# Altium footprint library Altium_Lib.PcbLib: 334 footprints (part 13 of 21)
Each footprint in its own frame and in the unit in brackets; x right, y up, seen from the top. Pads: shape width x height; smd on the part's side, far side on the other; paste and mask are expansions set on the pad; w line width, h text height; cw(c..) or ccw(c..) is an arc to the next point about the centre after c.
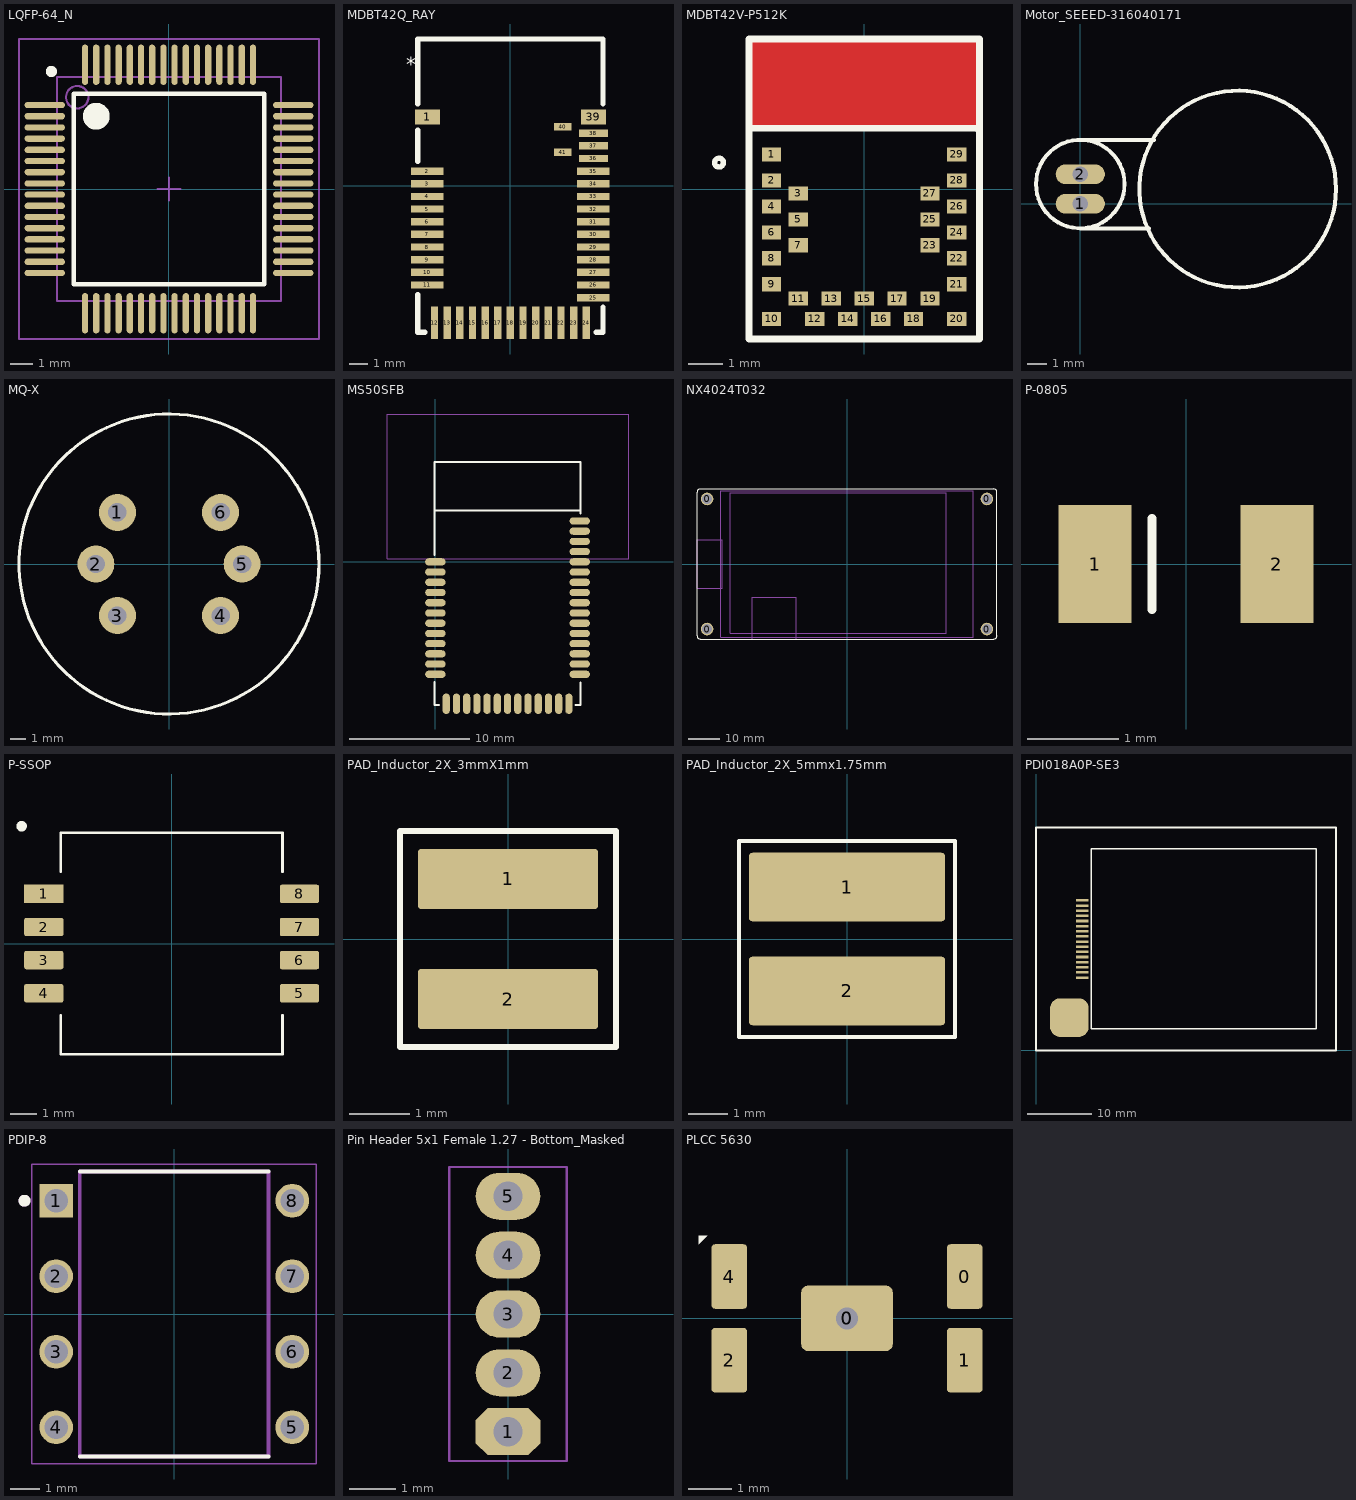
[diagram p12: the footprints below, top view; thin cyan lines are the x and y axes]

## LQFP-64_N [mm]
pads (64):
  oval 1.8x0.28 smd: 1(-5.55,3.75) 2(-5.55,3.25) 3(-5.55,2.75) 4(-5.55,2.25) 5(-5.55,1.75) 6(-5.55,1.25) 7(-5.55,0.75) 8(-5.55,0.25) 9(-5.55,-0.25) 10(-5.55,-0.75) 11(-5.55,-1.25) 12(-5.55,-1.75) 13(-5.55,-2.25) 14(-5.55,-2.75) 15(-5.55,-3.25) 16(-5.55,-3.75) 33(5.55,-3.75) 34(5.55,-3.25) 35(5.55,-2.75) 36(5.55,-2.25) 37(5.55,-1.75) 38(5.55,-1.25) 39(5.55,-0.75) 40(5.55,-0.25) 41(5.55,0.25) 42(5.55,0.75) 43(5.55,1.25) 44(5.55,1.75) 45(5.55,2.25) 46(5.55,2.75) 47(5.55,3.25) 48(5.55,3.75)
  oval 0.28x1.8 smd: 17(-3.75,-5.55) 18(-3.25,-5.55) 19(-2.75,-5.55) 20(-2.25,-5.55) 21(-1.75,-5.55) 22(-1.25,-5.55) 23(-0.75,-5.55) 24(-0.25,-5.55) 25(0.25,-5.55) 26(0.75,-5.55) 27(1.25,-5.55) 28(1.75,-5.55) 29(2.25,-5.55) 30(2.75,-5.55) 31(3.25,-5.55) 32(3.75,-5.55) 49(3.75,5.55) 50(3.25,5.55) 51(2.75,5.55) 52(2.25,5.55) 53(1.75,5.55) 54(1.25,5.55) 55(0.75,5.55) 56(0.25,5.55) 57(-0.25,5.55) 58(-0.75,5.55) 59(-1.25,5.55) 60(-1.75,5.55) 61(-2.25,5.55) 62(-2.75,5.55) 63(-3.25,5.55) 64(-3.75,5.55)
Top Overlay:
  circle w0.25: c-5.25,5.25 r0.125
  circle w0.6: c-3.25,3.25 r0.3
  lines w0.2: -4.25,-4.25 -4.25,4.25 4.25,4.25 4.25,-4.25 -4.25,-4.25
Mechanical 13:
  circle w0.1: c-4.1,4.1 r0.5
  lines w0.1: -5,-5 -5,5 5,5 5,-5 -5,-5
Mechanical 15:
  lines w0.1: -0.5,0 0.5,0 ; 0,-0.5 0,0.5 ; -6.7,-6.7 -6.7,6.7 6.7,6.7 6.7,-6.7 -6.7,-6.7
3D body "User Library-LQFP64_Grid_0_5.STEP": height 1.6, standoff 0, extent -5.999,-6 6.001,6

## MDBT42Q_RAY [mil]
pads (41):
  rect 55x32 smd: 1(-181.1,149.8) 39(181.1,149.8)
  rect 70.87x16 smd: 2(-181.1,31.7) 3(-181.1,4.1) 4(-181.1,-23.5) 5(-181.1,-51.1) 6(-181.1,-78.7) 7(-181.1,-106.3) 8(-181.1,-133.9) 9(-181.1,-161.5) 10(-181.1,-189.1) 11(-181.1,-216.7) 25(181.1,-244.3) 26(181.1,-216.7) 27(181.1,-189.1) 28(181.1,-161.5) 29(181.1,-133.9) 30(181.1,-106.3) 31(181.1,-78.7) 32(181.1,-51.1) 33(181.1,-23.5) 34(181.1,4.1) 35(181.1,31.7)
  rect 16x70.87 smd: 12(-165.6,-299.2) 13(-138,-299.2) 14(-110.4,-299.2) 15(-82.8,-299.2) 16(-55.2,-299.2) 17(-27.6,-299.2) 18(0,-299.2) 19(27.6,-299.2) 20(55.2,-299.2) 21(82.8,-299.2) 22(110.4,-299.2) 23(138,-299.2) 24(165.6,-299.2)
  rect 62.99x16 smd: 36(181.1,59.3) 37(181.1,86.9) 38(181.1,114.5)
  rect 39x16 smd: 40(114.2,128.3) 41(114.2,73.1)
Top Overlay:
  lines w11.81: -202,-237.8 -202,-320 -186.7,-320 ; -202,52.8 -202,120.7 ; -202,178.9 -202,320 202,320 202,178.9 ; 186.7,-320 202,-320 202,-265.4
  text "*" at -227,249.61 h31.25
Multi-Layer:
  pour cut-out: -202,320 202,320 202,-320 -202,-320
3D body "mdbt42q.stp": height 86.61, standoff 0, extent -197,-314.92 196.7,315

## MDBT42V-P512K [mil]
pads (29):
  rect 22x16 smd: 1(-105.31,39.37) 2(-105.31,9.84) 3(-74.8,-4.92) 4(-105.31,-19.68) 5(-74.8,-34.45) 6(-105.31,-49.21) 7(-74.8,-63.98) 8(-105.31,-78.74) 9(-105.31,-108.27) 10(-105.31,-147.64) 11(-74.8,-124.61) 12(-56.1,-147.64) 13(-37.4,-124.61) 14(-18.7,-147.64) 15(0,-124.61) 16(18.7,-147.64) 17(37.4,-124.61) 18(56.1,-147.64) 19(74.8,-124.61) 20(105.31,-147.64) 21(105.31,-108.27) 22(105.31,-78.74) 23(74.8,-63.98) 24(105.31,-49.21) 25(74.8,-34.45) 26(105.31,-19.68) 27(74.8,-4.92) 28(105.31,9.84) 29(105.31,39.37)
Top Layer:
  pour cut-out: -127.95,167.32 127.95,167.32 127.95,68.9 -127.95,68.9
Bottom Layer:
  pour cut-out: -127.95,167.32 127.95,167.32 127.95,68.9 -127.95,68.9
Top Overlay:
  circle w6: c-165,30 r5
  lines w7.87: -130.35,69.47 127.95,68.9 ; -131,-170.5 131,-170.5 131,170.5 -131,170.5 -131,-170.5
Mechanical 2:
  text "STAY AWAY" at -98.43,98.43 h39.37
3D body: height 55.12, standoff 3.94, extent -120,-160 120,55
3D body: height 19.68, standoff 0, extent -130,-170 130,170

## Motor_SEEED-316040171 [mm]
pads (2):
  oval 2.5x1 hole 0.8: 1(0,0) 2(0,1.5)
Top Overlay:
  circle w0.2: c0,1 r2.25
  circle w0.2: c8,0.75 r5
  lines w0.2: 0,-1.25 3.5,-1.25 ; 0,3.25 3.75,3.25
3D body "Vibration Motor v1.step": height 3, standoff -0.61, extent -0.474,-3.5 11.974,4.582

## MQ-X [mm] "MQ-X Type Gas Sensor"
height 10
pads (6):
  round 2.4 hole 1.2 unplated: 1(-3.35,3.35) 2(-4.75,0) 3(-3.35,-3.35) 4(3.35,-3.35) 5(4.75,0) 6(3.35,3.35)
Top Overlay:
  circle w0.2: c0,0 r9.75
3D body: height 10, standoff 8.8, extent -9.749,-9.749 9.749,9.749

## MS50SFB [mm] "Respect stay away lines if not model 3"
pads (41):
  oval 1.7x0.6 smd mask+0.06: 1(0,0) 2(0,-0.85) 3(0,-1.7) 4(0,-2.55) 5(0,-3.4) 6(0,-4.25) 7(0,-5.1) 8(0,-5.95) 9(0,-6.8) 10(0,-7.65) 11(0,-8.5) 12(0,-9.35) 26(12,-9.35) 27(12,-8.5) 28(12,-7.65) 29(12,-6.8) 30(12,-5.95) 31(12,-5.1) 32(12,-4.25) 33(12,-3.4) 34(12,-2.55) 35(12,-1.7) 36(12,-0.85) 37(12,0) 38(12,0.85) 39(12,1.701) 40(12,2.551) 41(12,3.401)
  oval 0.6x1.7 smd mask+0.06: 13(0.9,-11.8) 14(1.75,-11.8) 15(2.6,-11.8) 16(3.45,-11.8) 17(4.3,-11.8) 18(5.15,-11.8) 19(6,-11.8) 20(6.85,-11.8) 21(7.7,-11.8) 22(8.55,-11.8) 23(9.4,-11.8) 24(10.25,-11.8) 25(11.1,-11.8)
Top Overlay:
  lines w0.16: -0.075,-9.973 -0.075,-11.884 0.3,-11.884 ; -0.075,0.582 -0.075,8.291 12.075,8.291 12.075,4 ; -0.061,4.265 12.075,4.265 ; 11.643,-11.884 12.075,-11.884 12.075,-10.015
Mechanical 2:
  lines w0.1: -4,0.265 16.075,0.265 16.075,12.291 -4,12.291 -4,0.265
  text "STAY AWAY" at 2.31,5.81 h1.52
3D body: height 0.6, standoff 0, extent 0.025,-11.784 11.975,8.166
3D body: height 2, standoff 0.6, extent 0.9,-10.494 11.1,3.401

## NX4024T032 [mm]
pads (4):
  round 4 hole 3.2 unplated mask+0.05: 0(-44.3,-20.6) 0(-44.3,20.6) 0(44.3,-20.6) 0(44.3,20.6)
Top Overlay:
  lines w0.1: -47.5,-22.75 ccw(c-46.5,-22.75) -46.5,-23.75 46.5,-23.75 ; -47.5,-22.75 -47.5,-22.75 ; -47.5,-22.75 -47.5,22.75 cw(c-46.5,22.75) -46.5,23.75 ; -46.5,23.75 -46.5,23.75 ; -46.5,23.75 46.5,23.75 cw(c46.5,22.75) 47.5,22.75 47.5,-22.75 ; 46.5,-23.75 ccw(c46.5,-22.75) 47.5,-22.75 ; 46.5,-23.75 46.5,-23.75 ; 47.5,-22.75 47.5,-22.75
Mechanical 27:
  circle w0.1: c-44.3,-20.6 r1.6
  circle w0.1: c-44.3,20.6 r1.6
  circle w0.1: c44.3,20.6 r1.6
  circle w0.1: c44.3,-20.6 r1.6
Mechanical 28:
  lines w0.1: -40,-23.25 -40,23.25 40,23.25 40,-23.25 -40,-23.25
Mechanical 29:
  lines w0.1: -37,-22 -37,22.5 31.5,22.5 31.5,-22 -37,-22
Mechanical 30:
  lines w0.1: -47.5,-7.75 -47.5,7.75 -39.5,7.75 -39.5,-7.75 -47.5,-7.75
Mechanical 31:
  lines w0.1: -30,-23.75 -30,-10.5 -16,-10.5 -16,-23.75 ; -30,-23.75 -16,-23.75 ; -30,-23.75 -16,-23.75 ; -30,-23.75 -16,-23.75
3D body "NX4024T032.step": height 11.55, standoff 0, extent -47.5,-24 47.5,24

## P-0805 [mm]
pads (2):
  rect 0.8x1.3 smd: 1(-1,0) 2(1,0)
Top Overlay:
  lines w0.1: -0.375,-0.5 -0.375,0.5
3D body "SW3dPS-LED SMD0805.STEP": height 0.85, standoff 0.01, extent -1.031,-0.431 1.031,0.475

## P-SSOP [mm]
pads (8):
  rect 1.5x0.7 smd mask+0.05: 1(-4.9,1.905)
  rrect20% 1.5x0.7 smd mask+0.05: 2(-4.9,0.635) 3(-4.9,-0.635) 4(-4.9,-1.905) 5(4.9,-1.905) 6(4.9,-0.635) 7(4.9,0.635) 8(4.9,1.905)
Top Overlay:
  circle w0.2: c-5.75,4.5 r0.1
  lines w0.1: -4.25,-2.75 -4.25,-4.25 4.25,-4.25 4.25,-2.75 ; -4.25,2.75 -4.25,4.25 4.25,4.25 4.25,2.75
3D body "User Library-ZlozenieMPXH6400A.STEP": height 9.75, standoff 0.08, extent -5.325,-4.15 5.325,4.1

## PAD_Inductor_2X_3mmX1mm [mm]
pads (2):
  rrect10% 3x1 smd paste-3: 1(0,1) 2(0,-1)
Top Overlay:
  lines w0.1: -1.8,-1.8 -1.8,1.8 1.8,1.8 1.8,-1.8 -1.8,-1.8

## PAD_Inductor_2X_5mmx1.75mm [mm]
pads (2):
  rrect10% 5x1.75 smd: 1(0,1.325) 2(0,-1.325)
Top Overlay:
  lines w0.1: -2.75,-2.5 -2.75,2.5 2.75,2.5 2.75,-2.5 -2.75,-2.5

## PCM0802B-RN-YBS-02 [mm]
3D body "LCD_2x8.STEP": height 17.2, standoff 8.99, extent -1.7,-8.38 56.3,23.62

## PDI018A0P-SE3 [mm]
pads (17):
  rrect50% 2x0.4 smd paste-2: 1(7.2,11.35) 2(7.2,12.15) 3(7.2,12.95) 4(7.2,13.75) 5(7.2,14.55) 6(7.2,15.35) 7(7.2,16.15) 8(7.2,16.95) 9(7.2,17.75) 10(7.2,18.55) 11(7.2,19.35) 12(7.2,20.15) 13(7.2,20.95) 14(7.2,21.75) 15(7.2,22.55) 16(7.2,23.35)
  rrect50% 6x6 smd paste-6: ""(5.2,5.1)
Top Overlay:
  lines w0.254: 8.2,0 0,0 ; 0,0 0,34.7 46.7,34.7 46.7,0 0,0 ; 8.6,3.4 43.6,3.4 43.6,31.4 8.6,31.4 8.6,3.4
3D body "LCD.STEP": height 2.6, standoff 0.2, extent -0.05,0 46.7,34.7

## PDIP-8 [mm]
pads (8):
  rect 1.13x1.13 hole 0.78: 1(-3.97,3.81)
  round 1.13 hole 0.78: 2(-3.97,1.27) 3(-3.97,-1.27) 4(-3.97,-3.81) 5(3.97,-3.81) 6(3.97,-1.27) 7(3.97,1.27) 8(3.97,3.81)
Top Overlay:
  circle w0.2: c-5.035,3.81 r0.1
  lines w0.127: -3.175,-4.795 3.175,-4.795 ; -3.175,4.795 3.175,4.795
Mechanical 13:
  circle w0.2: c-5.035,3.81 r0.1
  lines w0.127: -3.175,-4.795 -3.175,4.795 3.175,4.795 3.175,-4.795 -3.175,-4.795
Mechanical 15:
  lines w0.05: -4.785,-5.045 -4.785,5.045 4.785,5.045 4.785,-5.045 -4.785,-5.045
3D body "step_temp.STEP": height 5.08, standoff -3.81, extent -3.937,-4.794 3.937,4.794

## Pin Header 5x1 Female 1.27 - Bottom_Masked [mil]
pads (5):
  oct 55x40 hole 25 mask+2: 1(0,-100)
  oval 55x40 hole 25 mask+2: 2(0,-50) 3(0,0) 4(0,50) 5(0,100)
Mechanical 13:
  lines w1.97: -50,-125 -50,125 50,125 50,-125 -50,-125

## PLCC 5630 [mm]
pads (6):
  rrect20% 2.1x1.5 smd: 0(0,0)
  round 1 hole 0.5: 0(0,0)
  rrect20% 0.82x1.48 smd: 0(2.7,0.96) 1(2.7,-0.96) 2(-2.7,-0.96) 4(-2.7,0.96)
Top Overlay:
  region: -3.2,1.9 -3.4,1.7 -3.4,1.9
3D body "User Library-5630.STEP": height 0.95, standoff -0.01, extent -2.85,-1.6 2.75,1.4